# Altium footprint library Connector.PcbLib: 148 footprints (part 7 of 10)
Each footprint in its own frame and in the unit in brackets; x right, y up, seen from the top. Pads: shape width x height; smd on the part's side, far side on the other; paste and mask are expansions set on the pad; w line width, h text height; cw(c..) or ccw(c..) is an arc to the next point about the centre after c.
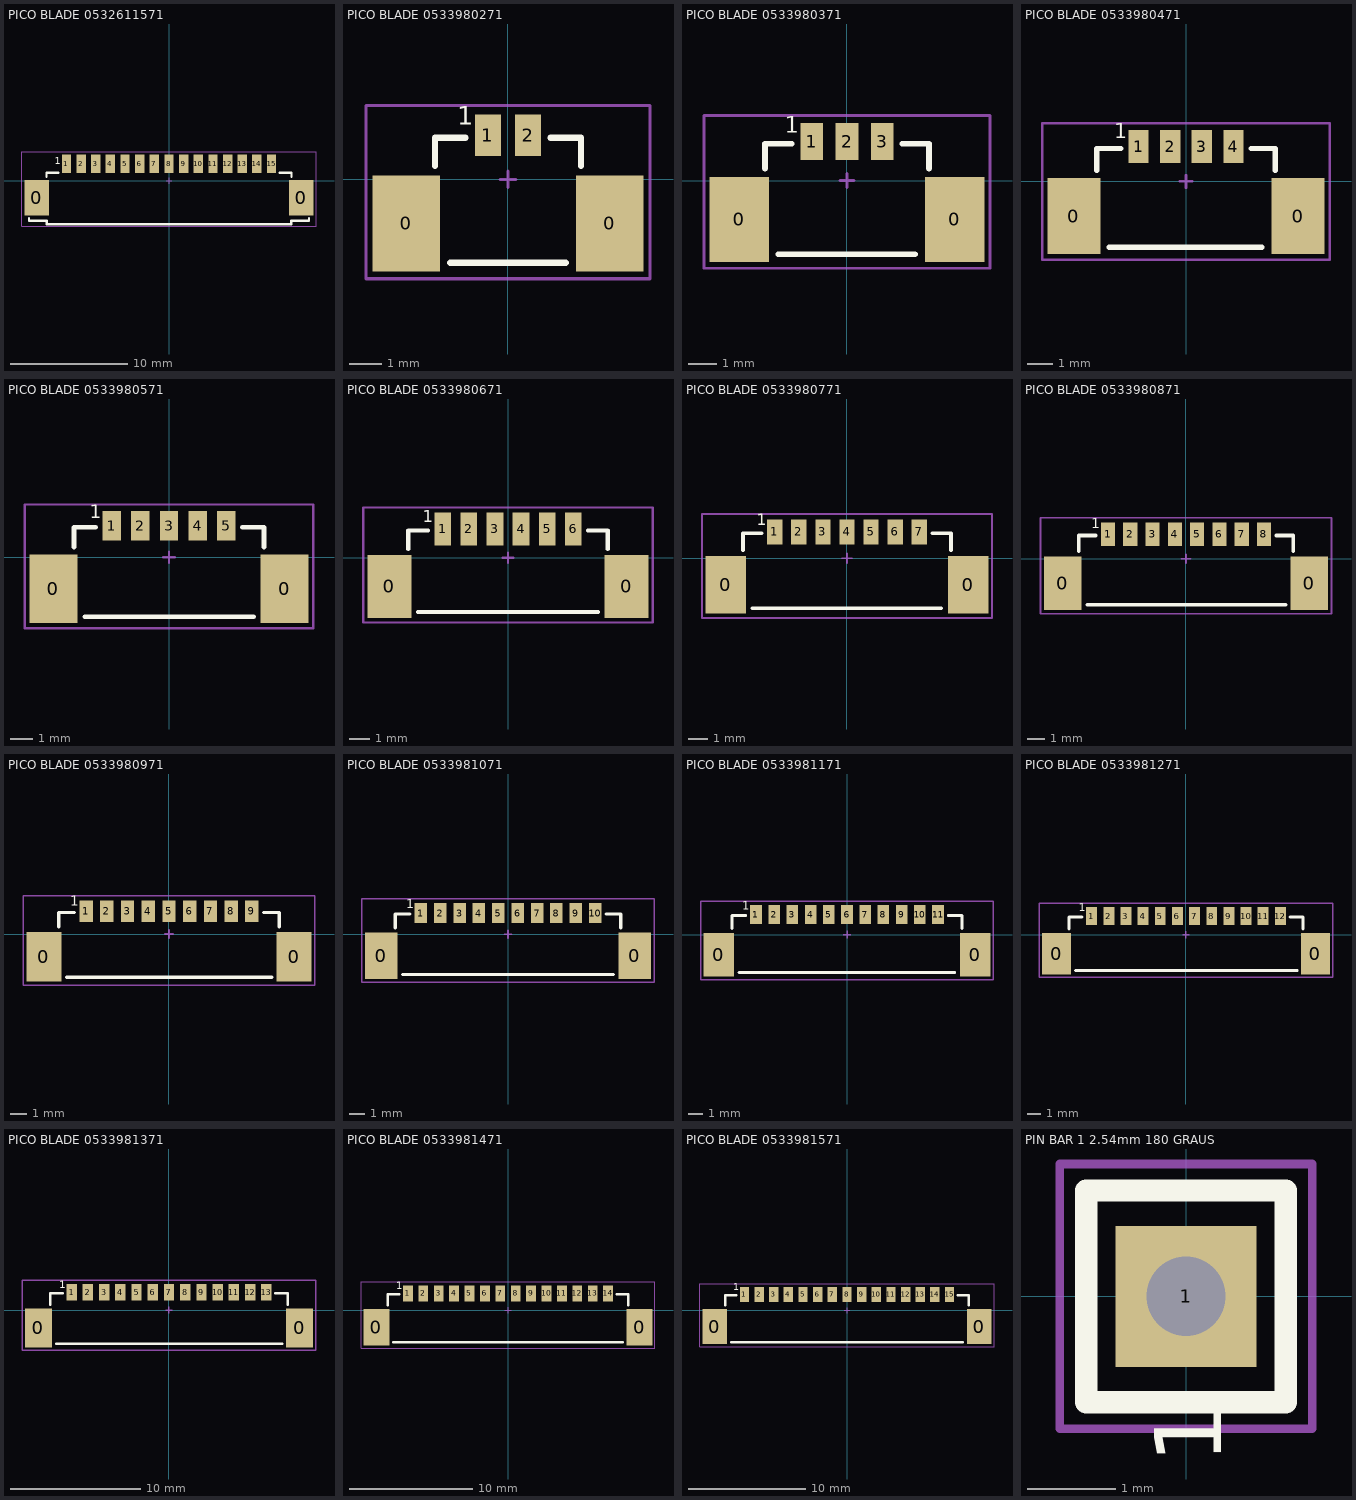
[diagram p6: the footprints below, top view; thin cyan lines are the x and y axes]

## PICO BLADE 0532611571 [mm]
height 3.4
pads (17):
  rect 2.1x3 smd: 0(-11.3,-1.45) 0(11.3,-1.45)
  rect 0.8x1.6 smd: 1(-8.75,1.45) 2(-7.5,1.45) 3(-6.25,1.45) 4(-5,1.45) 5(-3.75,1.45) 6(-2.5,1.45) 7(-1.25,1.45) 8(0,1.45) 9(1.25,1.45) 10(2.5,1.45) 11(3.75,1.45) 12(5,1.45) 13(6.25,1.45) 14(7.5,1.45) 15(8.75,1.45)
Top Overlay:
  lines w0.2: -11.95,-3.2 -11.95,-3.4 -10.436,-3.4 -10.436,-3.7 10.436,-3.7 10.436,-3.4 11.95,-3.4 11.95,-3.2 ; -10.45,0.35 -10.45,0.7 -9.45,0.7 ; 9.45,0.7 10.45,0.7 10.45,0.35
  text "1" at -9.75,1.2 h1
Mechanical 15:
  lines w0.1: -0.25,0 0.25,0 ; 0,-0.25 0,0.25 ; -12.55,-3.9 -12.55,2.5 12.55,2.5 12.55,-3.9 -12.55,-3.9
3D body "User Library-molex 53261 white (13).step": height 3.5, standoff 0, extent -11.95,-3.6 11.95,1.6

## PICO BLADE 0533980271 [mm]
height 4.7
pads (4):
  rect 2.1x3 smd: 0(-3.175,-1.375) 0(3.175,-1.375)
  rect 0.8x1.3 smd: 1(-0.625,1.375) 2(0.625,1.375)
Top Overlay:
  lines w0.2: -2.275,0.425 -2.275,1.3 -1.325,1.3 ; -1.8,-2.6 1.8,-2.6 ; 1.325,1.3 2.275,1.3 2.275,0.425
  text "1" at -1.575,1.5 h1
Mechanical 15:
  lines w0.1: -0.25,0 0.25,0 ; 0,-0.25 0,0.25 ; -4.425,-3.1 -4.425,2.3 4.425,2.3 4.425,-3.1 -4.425,-3.1
3D body "User Library-molex 53398 white.step": height 4.7, standoff 0, extent -3.825,-2.5 3.825,1.7

## PICO BLADE 0533980371 [mm]
height 4.7
pads (5):
  rect 2.1x3 smd: 0(-3.8,-1.375) 0(3.8,-1.375)
  rect 0.8x1.3 smd: 1(-1.25,1.375) 2(0,1.375) 3(1.25,1.375)
Top Overlay:
  lines w0.2: -2.9,0.425 -2.9,1.3 -1.95,1.3 ; -2.425,-2.6 2.4,-2.6 ; 1.95,1.3 2.9,1.3 2.9,0.425
  text "1" at -2.2,1.5 h1
Mechanical 15:
  lines w0.1: -0.25,0 0.25,0 ; 0,-0.25 0,0.25 ; -5.05,-3.1 -5.05,2.3 5.05,2.3 5.05,-3.1 -5.05,-3.1
3D body "User Library-molex 53398 white (1).step": height 4.7, standoff 0, extent -4.45,-2.5 4.45,1.7

## PICO BLADE 0533980471 [mm]
height 4.7
pads (6):
  rect 2.1x3 smd: 0(-4.425,-1.375) 0(4.425,-1.375)
  rect 0.8x1.3 smd: 1(-1.875,1.375) 2(-0.625,1.375) 3(0.625,1.375) 4(1.875,1.375)
Top Overlay:
  lines w0.2: -3.525,0.425 -3.525,1.3 -2.575,1.3 ; -3.05,-2.6 3,-2.6 ; 2.575,1.3 3.525,1.3 3.525,0.425
  text "1" at -2.825,1.5 h1
Mechanical 15:
  lines w0.1: -0.25,0 0.25,0 ; 0,-0.25 0,0.25 ; -5.675,-3.1 5.675,-3.1 5.675,2.3 -5.675,2.3 -5.675,-3.1
3D body "User Library-molex 53398 white (2).step": height 4.7, standoff 0, extent -5.075,-2.5 5.075,1.7

## PICO BLADE 0533980571 [mm]
height 4.7
pads (7):
  rect 2.1x3 smd: 0(-5.05,-1.375) 0(5.05,-1.375)
  rect 0.8x1.3 smd: 1(-2.5,1.375) 2(-1.25,1.375) 3(0,1.375) 4(1.25,1.375) 5(2.5,1.375)
Top Overlay:
  lines w0.2: -4.15,0.425 -4.15,1.3 -3.2,1.3 ; -3.675,-2.6 3.7,-2.6 ; 3.2,1.3 4.15,1.3 4.15,0.425
  text "1" at -3.45,1.5 h1
Mechanical 15:
  lines w0.1: -0.25,0 0.25,0 ; 0,-0.25 0,0.25 ; -6.3,-3.1 6.3,-3.1 6.3,2.3 -6.3,2.3 -6.3,-3.1
3D body "User Library-molex 53398 white (3).step": height 4.7, standoff 0, extent -5.7,-2.5 5.7,1.7

## PICO BLADE 0533980671 [mm]
height 4.7
pads (8):
  rect 2.1x3 smd: 0(-5.675,-1.375) 0(5.675,-1.375)
  rect 0.8x1.6 smd: 1(-3.125,1.375) 2(-1.875,1.375) 3(-0.625,1.375) 4(0.625,1.375) 5(1.875,1.375) 6(3.125,1.375)
Top Overlay:
  lines w0.2: -4.775,0.425 -4.775,1.3 -3.825,1.3 ; -4.3,-2.6 4.3,-2.6 ; 3.825,1.3 4.775,1.3 4.775,0.425
  text "1" at -4.075,1.5 h1
Mechanical 15:
  lines w0.1: -0.25,0 0.25,0 ; 0,-0.25 0,0.25 ; -6.925,-3.1 -6.925,2.4 6.925,2.4 6.925,-3.1 -6.925,-3.1
3D body "User Library-molex 53398 white (4).step": height 4.7, standoff 0, extent -6.325,-2.5 6.325,1.7

## PICO BLADE 0533980771 [mm]
height 4.7
pads (9):
  rect 2.1x3 smd: 0(-6.3,-1.375) 0(6.3,-1.375)
  rect 0.8x1.3 smd: 1(-3.75,1.375) 2(-2.5,1.375) 3(-1.25,1.375) 4(0,1.375) 5(1.25,1.375) 6(2.5,1.375) 7(3.75,1.375)
Top Overlay:
  lines w0.2: -5.4,0.425 -5.4,1.3 -4.45,1.3 ; -4.925,-2.6 4.9,-2.6 ; 4.45,1.3 5.4,1.3 5.4,0.425
  text "1" at -4.7,1.5 h1
Mechanical 15:
  lines w0.1: -0.25,0 0.25,0 ; 0,-0.25 0,0.25 ; -7.55,-3.1 -7.55,2.3 7.55,2.3 7.55,-3.1 -7.55,-3.1
3D body "User Library-molex 53398 white (5).step": height 4.7, standoff 0, extent -6.95,-2.5 6.95,1.7

## PICO BLADE 0533980871 [mm]
height 4.7
pads (10):
  rect 2.1x3 smd: 0(-6.925,-1.375) 0(6.925,-1.375)
  rect 0.8x1.3 smd: 1(-4.375,1.375) 2(-3.125,1.375) 3(-1.875,1.375) 4(-0.625,1.375) 5(0.625,1.375) 6(1.875,1.375) 7(3.125,1.375) 8(4.375,1.375)
Top Overlay:
  lines w0.2: -6.025,0.425 -6.025,1.3 -5.075,1.3 ; -5.55,-2.6 5.6,-2.6 ; 5.075,1.3 6.025,1.3 6.025,0.425
  text "1" at -5.325,1.5 h1
Mechanical 15:
  lines w0.1: -0.25,0 0.25,0 ; 0,-0.25 0,0.25 ; -8.175,-3.1 -8.175,2.3 8.175,2.3 8.175,-3.1 -8.175,-3.1
3D body "User Library-molex 53398 white (6).step": height 4.7, standoff 0, extent -7.575,-2.5 7.575,1.7

## PICO BLADE 0533980971 [mm]
height 4.7
pads (11):
  rect 2.1x3 smd: 0(-7.55,-1.375) 0(7.55,-1.375)
  rect 0.8x1.3 smd: 1(-5,1.375) 2(-3.75,1.375) 3(-2.5,1.375) 4(-1.25,1.375) 5(0,1.375) 6(1.25,1.375) 7(2.5,1.375) 8(3.75,1.375) 9(5,1.375)
Top Overlay:
  lines w0.2: -6.65,0.425 -6.65,1.3 -5.7,1.3 ; -6.175,-2.6 6.2,-2.6 ; 5.7,1.3 6.65,1.3 6.65,0.425
  text "1" at -5.95,1.5 h1
Mechanical 15:
  lines w0.1: -0.25,0 0.25,0 ; 0,-0.25 0,0.25 ; -8.8,-3.1 -8.8,2.3 8.8,2.3 8.8,-3.1 -8.8,-3.1
3D body "User Library-molex 53398 white (7).step": height 4.7, standoff 0, extent -8.2,-2.5 8.2,1.7

## PICO BLADE 0533981071 [mm]
height 4.7
pads (12):
  rect 2.1x3 smd: 0(-8.175,-1.375) 0(8.175,-1.375)
  rect 0.8x1.3 smd: 1(-5.625,1.375) 2(-4.375,1.375) 3(-3.125,1.375) 4(-1.875,1.375) 5(-0.625,1.375) 6(0.625,1.375) 7(1.875,1.375) 8(3.125,1.375) 9(4.375,1.375) 10(5.625,1.375)
Top Overlay:
  lines w0.2: -7.275,0.425 -7.275,1.3 -6.325,1.3 ; -6.8,-2.6 6.8,-2.6 ; 6.325,1.3 7.275,1.3 7.275,0.425
  text "1" at -6.575,1.5 h1
Mechanical 15:
  lines w0.1: -0.25,0 0.25,0 ; 0,-0.25 0,0.25 ; -9.425,-3.1 9.425,-3.1 9.425,2.3 -9.425,2.3 -9.425,-3.1
3D body "User Library-molex 53398 white (8).step": height 4.7, standoff 0, extent -8.825,-2.5 8.825,1.7

## PICO BLADE 0533981171 [mm]
height 4.7
pads (13):
  rect 2.1x3 smd: 0(-8.8,-1.375) 0(8.8,-1.375)
  rect 0.8x1.3 smd: 1(-6.25,1.375) 2(-5,1.375) 3(-3.75,1.375) 4(-2.5,1.375) 5(-1.25,1.375) 6(0,1.375) 7(1.25,1.375) 8(2.5,1.375) 9(3.75,1.375) 10(5,1.375) 11(6.25,1.375)
Top Overlay:
  lines w0.2: -7.9,0.425 -7.9,1.3 -6.95,1.3 ; -7.425,-2.6 7.4,-2.6 ; 6.95,1.3 7.9,1.3 7.9,0.425
  text "1" at -7.2,1.5 h1
Mechanical 15:
  lines w0.1: -0.25,0 0.25,0 ; 0,-0.25 0,0.25 ; -10.05,-3.1 -10.05,2.3 10.05,2.3 10.05,-3.1 -10.05,-3.1
3D body "User Library-molex 53398 white (9).step": height 4.7, standoff 0, extent -9.45,-2.5 9.45,1.7

## PICO BLADE 0533981271 [mm]
height 4.7
pads (14):
  rect 2.1x3 smd: 0(-9.425,-1.375) 0(9.425,-1.375)
  rect 0.8x1.3 smd: 1(-6.875,1.375) 2(-5.625,1.375) 3(-4.375,1.375) 4(-3.125,1.375) 5(-1.875,1.375) 6(-0.625,1.375) 7(0.625,1.375) 8(1.875,1.375) 9(3.125,1.375) 10(4.375,1.375) 11(5.625,1.375) 12(6.875,1.375)
Top Overlay:
  lines w0.2: -8.525,0.425 -8.525,1.3 -7.575,1.3 ; -8.05,-2.6 8.1,-2.6 ; 7.575,1.3 8.525,1.3 8.525,0.425
  text "1" at -7.825,1.5 h1
Mechanical 15:
  lines w0.1: -0.25,0 0.25,0 ; 0,-0.25 0,0.25 ; -10.675,-3.1 -10.675,2.3 10.675,2.3 10.675,-3.1 -10.675,-3.1
3D body "User Library-molex 53398 white (10).step": height 4.7, standoff 0, extent -10.075,-2.5 10.075,1.7

## PICO BLADE 0533981371 [mm]
height 4.7
pads (15):
  rect 2.1x3 smd: 0(-10.05,-1.375) 0(10.05,-1.375)
  rect 0.8x1.3 smd: 1(-7.5,1.375) 2(-6.25,1.375) 3(-5,1.375) 4(-3.75,1.375) 5(-2.5,1.375) 6(-1.25,1.375) 7(0,1.375) 8(1.25,1.375) 9(2.5,1.375) 10(3.75,1.375) 11(5,1.375) 12(6.25,1.375) 13(7.5,1.375)
Top Overlay:
  lines w0.2: -9.15,0.425 -9.15,1.3 -8.2,1.3 ; -8.675,-2.6 8.7,-2.6 ; 8.2,1.3 9.15,1.3 9.15,0.425
  text "1" at -8.45,1.5 h1
Mechanical 15:
  lines w0.1: -0.25,0 0.25,0 ; 0,-0.25 0,0.25 ; -11.3,-3.1 11.3,-3.1 11.3,2.3 -11.3,2.3 -11.3,-3.1
3D body "User Library-molex 53398 white (11).step": height 4.7, standoff 0, extent -10.7,-2.5 10.7,1.7

## PICO BLADE 0533981471 [mm]
height 4.7
pads (16):
  rect 2.1x3 smd: 0(-10.675,-1.375) 0(10.675,-1.375)
  rect 0.8x1.3 smd: 1(-8.125,1.375) 2(-6.875,1.375) 3(-5.625,1.375) 4(-4.375,1.375) 5(-3.125,1.375) 6(-1.875,1.375) 7(-0.625,1.375) 8(0.625,1.375) 9(1.875,1.375) 10(3.125,1.375) 11(4.375,1.375) 12(5.625,1.375) 13(6.875,1.375) 14(8.125,1.375)
Top Overlay:
  lines w0.2: -9.775,0.425 -9.775,1.3 -8.825,1.3 ; -9.3,-2.6 9.3,-2.6 ; 8.825,1.3 9.775,1.3 9.775,0.425
  text "1" at -9.075,1.5 h1
Mechanical 15:
  lines w0.1: -0.25,0 0.25,0 ; 0,-0.25 0,0.25 ; -11.925,-3.1 11.925,-3.1 11.925,2.3 -11.925,2.3 -11.925,-3.1
3D body "User Library-molex 53398 white (12).step": height 4.7, standoff 0, extent -11.325,-2.5 11.325,1.7

## PICO BLADE 0533981571 [mm]
height 4.7
pads (17):
  rect 2.1x3 smd: 0(-11.3,-1.375) 0(11.3,-1.375)
  rect 0.8x1.3 smd: 1(-8.75,1.375) 2(-7.5,1.375) 3(-6.25,1.375) 4(-5,1.375) 5(-3.75,1.375) 6(-2.5,1.375) 7(-1.25,1.375) 8(0,1.375) 9(1.25,1.375) 10(2.5,1.375) 11(3.75,1.375) 12(5,1.375) 13(6.25,1.375) 14(7.5,1.375) 15(8.75,1.375)
Top Overlay:
  lines w0.2: -10.4,0.425 -10.4,1.3 -9.45,1.3 ; -9.9,-2.7 9.9,-2.7 ; 9.45,1.3 10.4,1.3 10.4,0.425
  text "1" at -9.7,1.5 h1
Mechanical 15:
  lines w0.1: -0.25,0 0.25,0 ; 0,-0.25 0,0.25 ; -12.55,-3.1 -12.55,2.3 12.55,2.3 12.55,-3.1 -12.55,-3.1
3D body "User Library-molex 53398 white (13).step": height 4.7, standoff 0, extent -11.95,-2.5 11.95,1.7

## PIN BAR 1 2.54mm 180 GRAUS [mm] "HEADER 1 2.54mm 180 GRAUS"
height 8.64
pads (1):
  rect 1.6x1.6 hole 0.9: 1(0,0)
Top Overlay:
  lines w0.254: -1.13,-1.2 -1.13,1.2 1.13,1.2 1.13,-1.2 -1.13,-1.2
  text "1" at 0.4,-1.9 h0.76
Mechanical 15:
  lines w0.1: -0.25,0 0.25,0 ; 0,-0.25 0,0.25 ; -1.43,-1.5 -1.43,1.5 1.43,1.5 1.43,-1.5 -1.43,-1.5
3D body "User Library-Header_Male_1Pin.STEP": height 8.54, standoff -3, extent -1.27,-1.245 1.27,1.245